# Altium footprint library EwgConnectors.PcbLib: 125 footprints (part 5 of 8)
Each footprint in its own frame and in the unit in brackets; x right, y up, seen from the top. Pads: shape width x height; smd on the part's side, far side on the other; paste and mask are expansions set on the pad; w line width, h text height; cw(c..) or ccw(c..) is an arc to the next point about the centre after c.
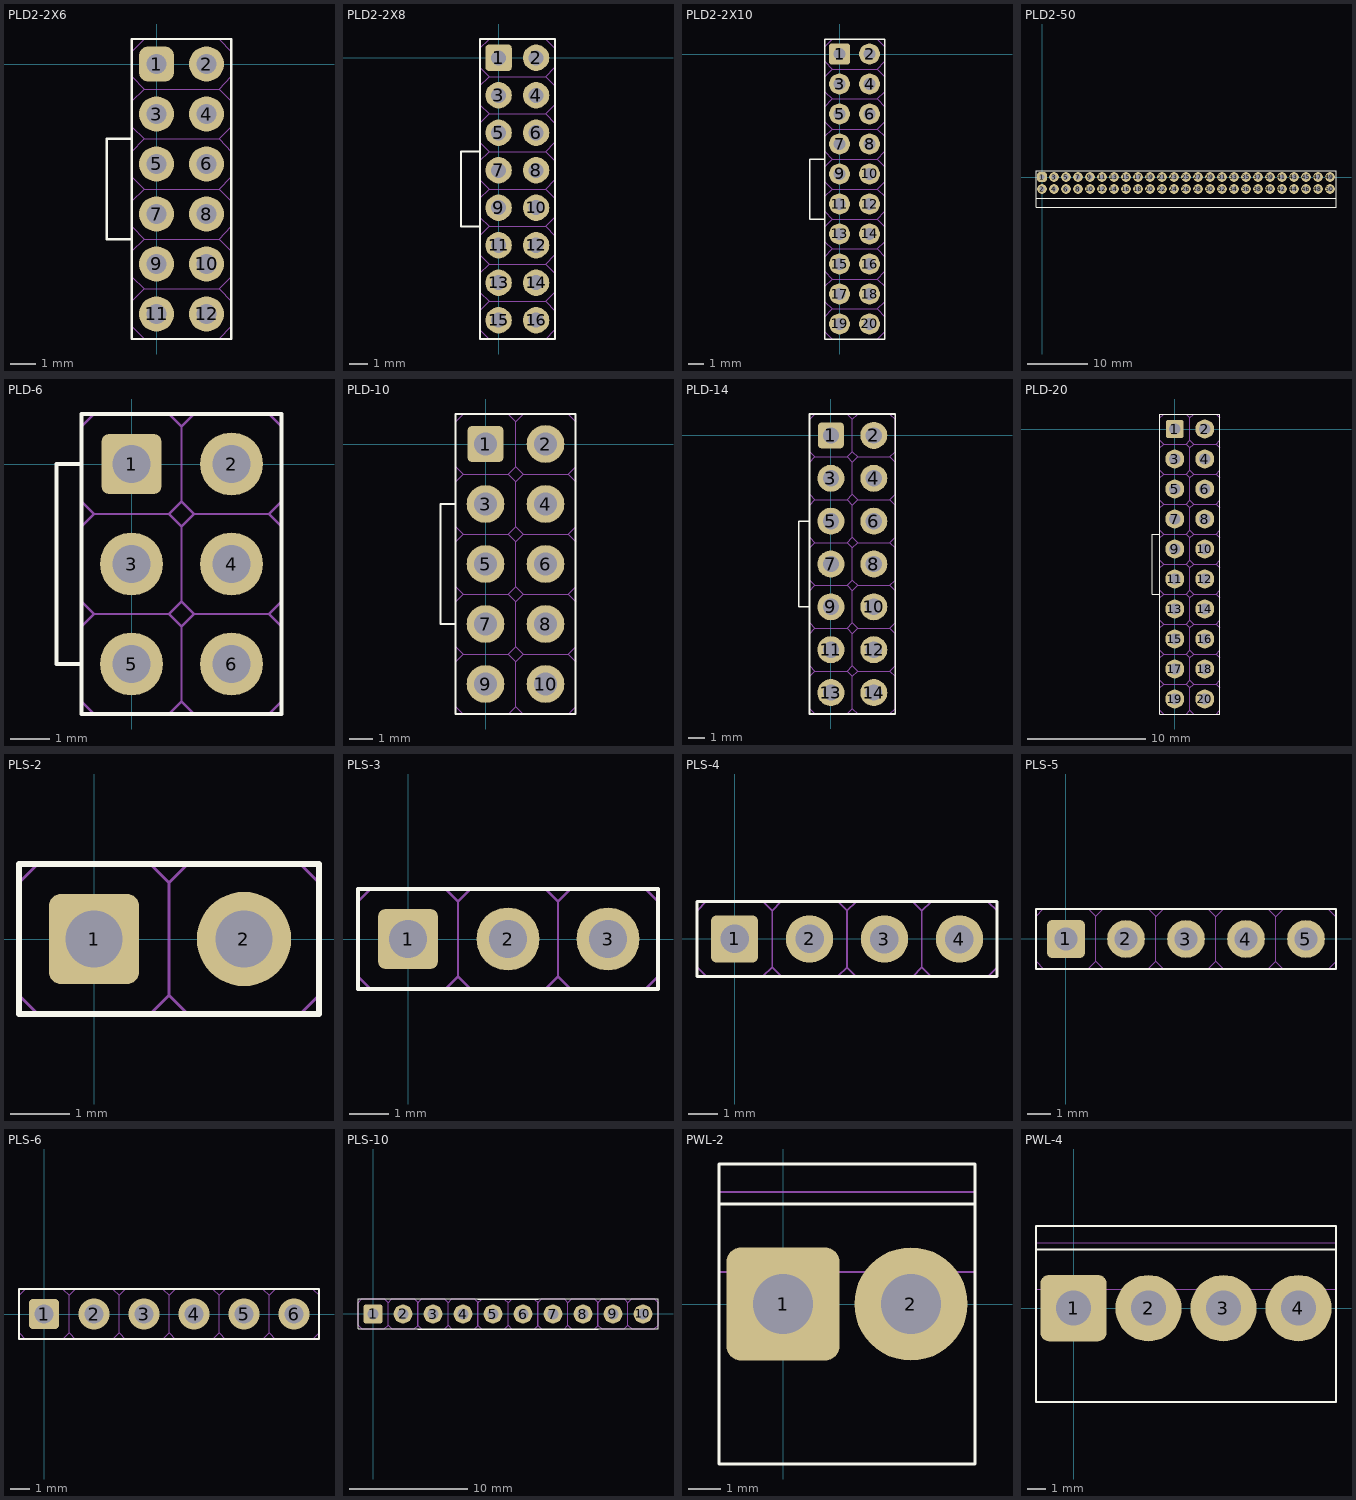
[diagram p4: the footprints below, top view; thin cyan lines are the x and y axes]

## PLD2-2X6 [mm]
pads (12):
  rrect50% 1.4x1.4 hole 0.8: 1(0,0)
  round 1.4 hole 0.8: 2(2,0) 3(0,-2) 4(2,-2) 5(0,-4) 6(2,-4) 7(0,-6) 8(2,-6) 9(0,-8) 10(2,-8) 12(2,-10)
  round 1.4 hole 0.8 paste+0: 11(0,-10)
Top Overlay:
  lines w0.1: -1,-7 -2,-7 -2,-3 -1,-3 ; -1,-11 -1,1 3,1 3,-11 -1,-11
Mechanical 1:
  lines w0.05: -0.5,-9 -1,-9.5 -1,-10.5 -0.5,-11 2.5,-11 3,-10.5 3,-9.5 2.5,-9 ; -0.5,-9 2.5,-9 ; -0.5,-9 2.5,-9 ; -0.5,-9 2.5,-9 ; -0.5,-9 -1,-8.5 -1,-7.5 -0.5,-7 ; -0.5,-7 2.5,-7 ; -0.5,-7 2.5,-7 ; -0.5,-7 -1,-6.5 -1,-5.5 -0.5,-5 ; -0.5,-5 2.5,-5 ; -0.5,-5 2.5,-5 ; -0.5,-5 -1,-4.5 -1,-3.5 -0.5,-3 ; -0.5,-3 2.5,-3 ; -0.5,-3 2.5,-3 ; -0.5,-3 -1,-2.5 -1,-1.5 -0.5,-1 ; -0.5,-1 2.5,-1 ; -0.5,-1 2.5,-1 ; -0.5,-1 -1,-0.5 -1,0.5 -0.5,1 2.5,1 3,0.5 3,-0.5 2.5,-1 ; 2.5,-9 3,-8.5 3,-7.5 2.5,-7 ; 2.5,-7 3,-6.5 3,-5.5 2.5,-5 ; 2.5,-5 3,-4.5 3,-3.5 2.5,-3 ; 2.5,-3 3,-2.5 3,-1.5 2.5,-1 ; -0.25,-10.25 -0.25,-9.75 0.25,-9.75 0.25,-10.25 -0.25,-10.25 ; -0.25,-8.25 0.25,-8.25 0.25,-7.75 -0.25,-7.75 -0.25,-8.25 ; -0.25,-6.25 0.25,-6.25 0.25,-5.75 -0.25,-5.75 -0.25,-6.25 ; -0.25,-4.25 0.25,-4.25 0.25,-3.75 -0.25,-3.75 -0.25,-4.25 ; -0.25,-2.25 0.25,-2.25 0.25,-1.75 -0.25,-1.75 -0.25,-2.25 ; -0.25,-0.25 0.25,-0.25 0.25,0.25 -0.25,0.25 -0.25,-0.25 ; 1.75,-10.25 1.75,-9.75 2.25,-9.75 2.25,-10.25 1.75,-10.25 ; 1.75,-8.25 2.25,-8.25 2.25,-7.75 1.75,-7.75 1.75,-8.25 ; 1.75,-6.25 2.25,-6.25 2.25,-5.75 1.75,-5.75 1.75,-6.25 ; 1.75,-4.25 2.25,-4.25 2.25,-3.75 1.75,-3.75 1.75,-4.25 ; 1.75,-2.25 2.25,-2.25 2.25,-1.75 1.75,-1.75 1.75,-2.25 ; 1.75,-0.25 2.25,-0.25 2.25,0.25 1.75,0.25 1.75,-0.25
3D body: height 6, standoff -2.8, extent -1,-11 3,1

## PLD2-2X8 [mm]
pads (16):
  rrect25% 1.4x1.4 hole 0.8: 1(0,0)
  round 1.4 hole 0.8: 2(2,0) 3(0,-2) 4(2,-2) 5(0,-4) 6(2,-4) 7(0,-6) 8(2,-6) 9(0,-8) 10(2,-8) 11(0,-10) 12(2,-10) 13(0,-12) 14(2,-12) 15(0,-14) 16(2,-14)
Top Overlay:
  lines w0.1: -1,-9 -2,-9 -2,-5 -1,-5 ; -1,-15 -1,1 3,1 3,-15 -1,-15
Mechanical 1:
  lines w0.05: -0.5,-13 -1,-12.5 -1,-11.5 -0.5,-11 ; -0.5,-13 -1,-13.5 -1,-14.5 -0.5,-15 2.5,-15 3,-14.5 3,-13.5 2.5,-13 ; -0.5,-13 2.5,-13 ; -0.5,-13 2.5,-13 ; -0.5,-11 -1,-10.5 -1,-9.5 -0.5,-9 ; -0.5,-11 2.5,-11 ; -0.5,-11 2.5,-11 ; -0.5,-9 -1,-8.5 -1,-7.5 -0.5,-7 ; -0.5,-9 2.5,-9 ; -0.5,-9 2.5,-9 ; -0.5,-7 -1,-6.5 -1,-5.5 -0.5,-5 ; -0.5,-7 2.5,-7 ; -0.5,-7 2.5,-7 ; -0.5,-5 -1,-4.5 -1,-3.5 -0.5,-3 ; -0.5,-5 2.5,-5 ; -0.5,-5 2.5,-5 ; -0.5,-3 -1,-2.5 -1,-1.5 -0.5,-1 ; -0.5,-3 2.5,-3 ; -0.5,-3 2.5,-3 ; -0.5,-1 -1,-0.5 -1,0.5 -0.5,1 2.5,1 3,0.5 3,-0.5 2.5,-1 ; -0.5,-1 2.5,-1 ; -0.5,-1 2.5,-1 ; 2.5,-13 3,-12.5 3,-11.5 2.5,-11 ; 2.5,-11 3,-10.5 3,-9.5 2.5,-9 ; 2.5,-9 3,-8.5 3,-7.5 2.5,-7 ; 2.5,-7 3,-6.5 3,-5.5 2.5,-5 ; 2.5,-5 3,-4.5 3,-3.5 2.5,-3 ; 2.5,-3 3,-2.5 3,-1.5 2.5,-1 ; -0.25,-14.25 -0.25,-13.75 0.25,-13.75 0.25,-14.25 -0.25,-14.25 ; -0.25,-12.25 -0.25,-11.75 0.25,-11.75 0.25,-12.25 -0.25,-12.25 ; -0.25,-10.25 -0.25,-9.75 0.25,-9.75 0.25,-10.25 -0.25,-10.25 ; -0.25,-8.25 -0.25,-7.75 0.25,-7.75 0.25,-8.25 -0.25,-8.25 ; -0.25,-6.25 -0.25,-5.75 0.25,-5.75 0.25,-6.25 -0.25,-6.25 ; -0.25,-4.25 -0.25,-3.75 0.25,-3.75 0.25,-4.25 -0.25,-4.25 ; -0.25,-2.25 -0.25,-1.75 0.25,-1.75 0.25,-2.25 -0.25,-2.25 ; -0.25,-0.25 -0.25,0.25 0.25,0.25 0.25,-0.25 -0.25,-0.25 ; 1.75,-14.25 1.75,-13.75 2.25,-13.75 2.25,-14.25 1.75,-14.25 ; 1.75,-12.25 1.75,-11.75 2.25,-11.75 2.25,-12.25 1.75,-12.25 ; 1.75,-10.25 1.75,-9.75 2.25,-9.75 2.25,-10.25 1.75,-10.25 ; 1.75,-8.25 1.75,-7.75 2.25,-7.75 2.25,-8.25 1.75,-8.25 ; 1.75,-6.25 1.75,-5.75 2.25,-5.75 2.25,-6.25 1.75,-6.25 ; 1.75,-4.25 1.75,-3.75 2.25,-3.75 2.25,-4.25 1.75,-4.25 ; 1.75,-2.25 1.75,-1.75 2.25,-1.75 2.25,-2.25 1.75,-2.25 ; 1.75,-0.25 2.25,-0.25 2.25,0.25 1.75,0.25 1.75,-0.25

## PLD2-2X10 [mm]
pads (20):
  rrect25% 1.4x1.4 hole 0.8: 1(0,0)
  round 1.4 hole 0.8: 2(2,0) 3(0,-2) 4(2,-2) 5(0,-4) 6(2,-4) 7(0,-6) 8(2,-6) 9(0,-8) 10(2,-8) 11(0,-10) 12(2,-10) 13(0,-12) 14(2,-12) 15(0,-14) 16(2,-14) 17(0,-16) 18(2,-16) 19(0,-18) 20(2,-18)
Top Overlay:
  lines w0.1: -1,-11 -2,-11 -2,-7 -1,-7 ; -1,-19 3,-19 3,1 -1,1 -1,-19
Mechanical 1:
  drawing of 160 lines, arcs and shapes, not listed

## PLD2-50 [mm] "PLD2-50"
pads (50):
  rrect50% 1.6x1.6 hole 0.8: 1(0,0)
  round 1.6 hole 0.8: 2(0,-2) 3(2,0) 4(2,-2) 5(4,0) 6(4,-2) 7(6,0) 8(6,-2) 9(8,0) 10(8,-2) 11(10,0) 12(10,-2) 13(12,0) 14(12,-2) 15(14,0) 16(14,-2) 17(16,0) 18(16,-2) 19(18,0) 20(18,-2) 21(20,0) 22(20,-2) 23(22,0) 24(22,-2) 25(24,0) 26(24,-2) 27(26,0) 28(26,-2) 29(28,0) 30(28,-2) 31(30,0) 32(30,-2) 33(32,0) 34(32,-2) 35(34,0) 36(34,-2) 37(36,0) 38(36,-2) 39(38,0) 40(38,-2) 41(40,0) 42(40,-2) 43(42,0) 44(42,-2) 45(44,0) 46(44,-2) 47(46,0) 48(46,-2) 49(48,0) 50(48,-2)
Top Overlay:
  lines w0.1: -1,-3.5 49,-3.5 ; -1,-3.5 -1,-5 49,-5 49,-3.5 ; -1,-3.5 -1,1 49,1 49,-3.5
3D body: height 4, standoff -2.8, extent -1,-9 49,0.25

## PLD-6 [mm]
pads (6):
  rrect25% 1.524x1.524 hole 0.965: 1(0,0)
  round 1.6 hole 0.965: 2(2.54,0) 3(0,-2.54) 4(2.54,-2.54) 5(0,-5.08) 6(2.54,-5.08)
Top Overlay:
  lines w0.1: -1.27,-2.54 -1.27,-5.08 -1.905,-5.08 -1.905,0 -1.27,0 ; -1.27,-6.35 -1.27,-3.81 -1.27,-1.27 -1.27,1.27 3.81,1.27 3.81,-1.27 3.81,-3.81 3.81,-6.35 -1.27,-6.35
Mechanical 1:
  lines w0.05: -0.953,-6.35 -1.27,-6.032 -1.27,-4.127 -0.953,-3.81 ; -0.953,-6.35 0.953,-6.35 ; -0.953,-6.35 0.953,-6.35 ; -0.953,-3.81 -1.27,-3.492 -1.27,-1.587 -0.953,-1.27 ; -0.953,-3.81 0.953,-3.81 ; -0.953,-3.81 0.953,-3.81 ; -0.953,-1.27 -1.27,-0.953 -1.27,0.953 -0.953,1.27 0.953,1.27 1.27,0.953 ; -0.953,-1.27 0.953,-1.27 ; -0.953,-1.27 0.953,-1.27 ; 0.953,-6.35 1.27,-6.032 ; 0.953,-3.81 1.27,-3.492 ; 0.953,-3.81 1.27,-4.127 ; 0.953,-1.27 1.27,-0.953 ; 0.953,-1.27 1.27,-1.587 ; 1.27,-6.032 1.587,-6.35 ; 1.27,-6.032 1.27,-4.127 ; 1.27,-4.127 1.587,-3.81 ; 1.27,-3.492 1.587,-3.81 ; 1.27,-3.492 1.27,-1.587 ; 1.27,-1.587 1.587,-1.27 ; 1.27,-0.953 1.587,-1.27 ; 1.27,-0.953 1.27,0.953 ; 1.27,0.953 1.587,1.27 3.492,1.27 3.81,0.953 3.81,-0.953 3.492,-1.27 ; 1.587,-6.35 3.492,-6.35 ; 1.587,-6.35 3.492,-6.35 ; 1.587,-3.81 3.492,-3.81 ; 1.587,-3.81 3.492,-3.81 ; 1.587,-1.27 3.492,-1.27 ; 1.587,-1.27 3.492,-1.27 ; 3.492,-6.35 3.81,-6.032 3.81,-4.127 3.492,-3.81 ; 3.492,-3.81 3.81,-3.492 3.81,-1.587 3.492,-1.27 ; -0.318,-5.397 -0.318,-4.763 0.318,-4.763 0.318,-5.397 -0.318,-5.397 ; -0.318,-2.857 -0.318,-2.222 0.318,-2.222 0.318,-2.857 -0.318,-2.857 ; -0.318,-0.318 -0.318,0.318 0.318,0.318 0.318,-0.318 -0.318,-0.318 ; 2.222,-5.397 2.857,-5.397 2.857,-4.763 2.222,-4.763 2.222,-5.397 ; 2.222,-2.857 2.857,-2.857 2.857,-2.222 2.222,-2.222 2.222,-2.857 ; 2.222,-0.318 2.222,0.318 2.857,0.318 2.857,-0.318 2.222,-0.318

## PLD-10 [mm]
pads (10):
  rrect25% 1.524x1.524 hole 0.965: 1(0,0)
  round 1.6 hole 0.965: 2(2.54,0) 3(0,-2.54) 4(2.54,-2.54) 5(0,-5.08) 6(2.54,-5.08) 7(0,-7.62) 8(2.54,-7.62) 9(0,-10.16) 10(2.54,-10.16)
Top Overlay:
  lines w0.1: -1.27,-5.08 -1.27,-2.54 -1.905,-2.54 -1.905,-7.62 -1.27,-7.62 ; -1.27,-7.62 -1.27,-11.43 3.81,-11.43 3.81,-8.89 3.81,-6.35 3.81,-3.81 3.81,-1.27 3.81,1.27 -1.27,1.27 -1.27,-1.27 -1.27,-3.81 -1.27,-7.62
Mechanical 1:
  lines w0.05: -0.953,-8.89 0.953,-8.89 ; -0.953,-8.89 0.953,-8.89 ; -0.953,-8.89 -1.27,-9.207 -1.27,-11.112 -0.953,-11.43 0.953,-11.43 1.27,-11.112 ; -0.953,-8.89 -1.27,-8.572 -1.27,-6.667 -0.953,-6.35 ; -0.953,-6.35 0.953,-6.35 ; -0.953,-6.35 0.953,-6.35 ; -0.953,-6.35 -1.27,-6.032 -1.27,-4.127 -0.953,-3.81 ; -0.953,-3.81 0.953,-3.81 ; -0.953,-3.81 0.953,-3.81 ; -0.953,-3.81 -1.27,-3.492 -1.27,-1.587 -0.953,-1.27 ; -0.953,-1.27 0.953,-1.27 ; -0.953,-1.27 0.953,-1.27 ; -0.953,-1.27 -1.27,-0.953 -1.27,0.953 -0.953,1.27 0.953,1.27 1.27,0.953 ; 0.953,-8.89 1.27,-9.207 ; 0.953,-8.89 1.27,-8.572 ; 0.953,-6.35 1.27,-6.667 ; 0.953,-6.35 1.27,-6.032 ; 0.953,-3.81 1.27,-4.127 ; 0.953,-3.81 1.27,-3.492 ; 0.953,-1.27 1.27,-1.587 ; 0.953,-1.27 1.27,-0.953 ; 1.27,-11.112 1.27,-9.207 ; 1.27,-11.112 1.587,-11.43 3.492,-11.43 3.81,-11.112 3.81,-9.207 3.492,-8.89 ; 1.27,-9.207 1.587,-8.89 ; 1.27,-8.572 1.27,-6.667 ; 1.27,-8.572 1.587,-8.89 ; 1.27,-6.667 1.587,-6.35 ; 1.27,-6.032 1.27,-4.127 ; 1.27,-6.032 1.587,-6.35 ; 1.27,-4.127 1.587,-3.81 ; 1.27,-3.492 1.27,-1.587 ; 1.27,-3.492 1.587,-3.81 ; 1.27,-1.587 1.587,-1.27 ; 1.27,-0.953 1.27,0.953 ; 1.27,-0.953 1.587,-1.27 ; 1.27,0.953 1.587,1.27 3.492,1.27 3.81,0.953 3.81,-0.953 3.492,-1.27 ; 1.587,-8.89 3.492,-8.89 ; 1.587,-8.89 3.492,-8.89 ; 1.587,-6.35 3.492,-6.35 ; 1.587,-6.35 3.492,-6.35 ; 1.587,-3.81 3.492,-3.81 ; 1.587,-3.81 3.492,-3.81 ; 1.587,-1.27 3.492,-1.27 ; 1.587,-1.27 3.492,-1.27 ; 3.492,-8.89 3.81,-8.572 3.81,-6.667 3.492,-6.35 ; 3.492,-6.35 3.81,-6.032 3.81,-4.127 3.492,-3.81 ; 3.492,-3.81 3.81,-3.492 3.81,-1.587 3.492,-1.27 ; -0.318,-10.477 0.318,-10.477 0.318,-9.842 -0.318,-9.842 -0.318,-10.477 ; -0.318,-7.938 0.318,-7.938 0.318,-7.302 -0.318,-7.302 -0.318,-7.938 ; -0.318,-5.397 0.318,-5.397 0.318,-4.763 -0.318,-4.763 -0.318,-5.397 ; -0.318,-2.857 0.318,-2.857 0.318,-2.222 -0.318,-2.222 -0.318,-2.857 ; -0.318,-0.318 0.318,-0.318 0.318,0.318 -0.318,0.318 -0.318,-0.318 ; 2.222,-10.477 2.222,-9.842 2.857,-9.842 2.857,-10.477 2.222,-10.477 ; 2.222,-7.938 2.857,-7.938 2.857,-7.302 2.222,-7.302 2.222,-7.938 ; 2.222,-5.397 2.857,-5.397 2.857,-4.763 2.222,-4.763 2.222,-5.397 ; 2.222,-2.857 2.222,-2.222 2.857,-2.222 2.857,-2.857 2.222,-2.857 ; 2.222,-0.318 2.857,-0.318 2.857,0.318 2.222,0.318 2.222,-0.318

## PLD-14 [mm]
pads (14):
  rrect25% 1.524x1.524 hole 0.965: 1(0,0)
  round 1.6 hole 0.965: 2(2.54,0) 3(0,-2.54) 4(2.54,-2.54) 5(0,-5.08) 6(2.54,-5.08) 7(0,-7.62) 8(2.54,-7.62) 9(0,-10.16) 10(2.54,-10.16) 11(0,-12.7) 12(2.54,-12.7) 13(0,-15.24) 14(2.54,-15.24)
Top Overlay:
  lines w0.1: -1.27,-10.16 -1.905,-10.16 -1.905,-5.08 -1.27,-5.08 ; -1.27,-16.51 -1.27,-13.97 -1.27,-11.43 -1.27,-8.89 -1.27,-6.35 -1.27,-3.81 -1.27,-1.27 -1.27,1.27 3.81,1.27 3.81,-1.27 3.81,-3.81 3.81,-6.35 3.81,-8.89 3.81,-11.43 3.81,-13.97 3.81,-16.51 -1.27,-16.51
Mechanical 1:
  drawing of 161 lines, arcs and shapes, not listed

## PLD-20 [mm]
pads (20):
  rrect25% 1.524x1.524 hole 0.965: 1(0,0)
  round 1.6 hole 0.965: 2(2.54,0) 3(0,-2.54) 4(2.54,-2.54) 5(0,-5.08) 6(2.54,-5.08) 7(0,-7.62) 8(2.54,-7.62) 9(0,-10.16) 10(2.54,-10.16) 11(0,-12.7) 12(2.54,-12.7) 13(0,-15.24) 14(2.54,-15.24) 15(0,-17.78) 16(2.54,-17.78) 17(0,-20.32) 18(2.54,-20.32) 19(0,-22.86) 20(2.54,-22.86)
Top Overlay:
  lines w0.1: -1.27,-13.97 -1.27,-11.43 -1.27,-8.89 ; -1.27,-13.97 -1.27,-16.51 -1.27,-24.13 3.81,-24.13 3.81,-16.51 3.81,-13.97 3.81,-11.43 3.81,-8.89 3.81,-6.35 3.81,-3.81 3.81,-1.27 3.81,1.27 -1.27,1.27 -1.27,-1.27 -1.27,-3.81 -1.27,-6.35 -1.27,-8.89 ; -1.27,-13.97 -1.905,-13.97 -1.905,-8.89 -1.27,-8.89
Mechanical 1:
  drawing of 228 lines, arcs and shapes, not listed

## PLS-2 [mil]
pads (2):
  rrect25% 60x60 hole 38: 1(0,0)
  round 62.99 hole 38: 2(100,0)
Top Overlay:
  lines w3.94: -50,-50 -50,50 150,50 150,-50 -50,-50
Mechanical 1:
  lines w1.97: 50,-37.5 37.5,-50 -37.5,-50 -50,-37.5 -50,37.5 -37.5,50 37.5,50 50,37.5 ; 50,-37.5 62.5,-50 137.5,-50 150,-37.5 150,37.5 137.5,50 62.5,50 50,37.5 ; 50,-37.5 50,37.5 ; -12.5,-12.5 -12.5,12.5 12.5,12.5 12.5,-12.5 -12.5,-12.5 ; 87.5,-12.5 112.5,-12.5 112.5,12.5 87.5,12.5 87.5,-12.5
3D body: height 336.22, standoff -118.11, extent -49.99,-49.99 50.01,50.01
3D body: height 336.22, standoff -118.11, extent 50,-49.99 150,50.01

## PLS-3 [mil]
pads (3):
  rrect25% 60x60 hole 38: 1(0,0)
  round 62.99 hole 38: 2(100,0) 3(200,0)
Top Overlay:
  lines w3.94: -50,-50 250,-50 250,50 -50,50 -50,-50
Mechanical 1:
  lines w1.97: 50,-37.5 50,37.5 ; 50,-37.5 62.5,-50 137.5,-50 150,-37.5 ; 50,-37.5 37.5,-50 -37.5,-50 -50,-37.5 -50,37.5 -37.5,50 37.5,50 50,37.5 ; 50,37.5 62.5,50 137.5,50 150,37.5 ; 150,-37.5 150,37.5 ; 150,-37.5 162.5,-50 237.5,-50 250,-37.5 250,37.5 237.5,50 162.5,50 150,37.5 ; -12.5,-12.5 12.5,-12.5 12.5,12.5 -12.5,12.5 -12.5,-12.5 ; 87.5,-12.5 87.5,12.5 112.5,12.5 112.5,-12.5 87.5,-12.5 ; 187.5,-12.5 187.5,12.5 212.5,12.5 212.5,-12.5 187.5,-12.5
3D body: height 420, standoff -110, extent -50.39,-50.94 249.61,49.06

## PLS-4 [mm]
pads (4):
  rrect25% 1.6x1.6 hole 0.965: 1(0,0)
  round 1.6 hole 0.965: 2(2.54,0) 3(5.08,0) 4(7.62,0)
Top Overlay:
  lines w0.1: 3.81,-1.27 8.89,-1.27 8.89,1.27 ; 8.75,-1.27 -1.27,-1.27 -1.27,1.27 8.875,1.27
Mechanical 1:
  lines w0.05: 1.27,-0.953 0.953,-1.27 -0.953,-1.27 -1.27,-0.953 -1.27,0.953 -0.953,1.27 0.953,1.27 1.27,0.953 ; 1.27,-0.953 1.587,-1.27 3.492,-1.27 3.81,-0.953 ; 1.27,-0.953 1.27,0.953 ; 1.27,0.953 1.587,1.27 3.492,1.27 3.81,0.953 ; 3.81,-0.953 3.81,0.952 ; 3.81,-0.953 4.127,-1.27 6.032,-1.27 6.35,-0.953 ; 3.81,-0.953 3.81,0.953 ; 3.81,0.952 4.127,1.27 6.032,1.27 6.35,0.952 ; 6.35,-0.953 6.35,0.952 ; 6.35,-0.953 6.667,-1.27 8.572,-1.27 8.89,-0.953 8.89,0.952 8.572,1.27 6.667,1.27 6.35,0.952 ; -0.318,-0.318 -0.318,0.318 0.318,0.318 0.318,-0.318 -0.318,-0.318 ; 2.222,-0.318 2.857,-0.318 2.857,0.318 2.222,0.318 2.222,-0.318 ; 4.762,-0.318 5.397,-0.318 5.397,0.317 4.762,0.317 4.762,-0.318 ; 7.302,-0.318 7.302,0.317 7.937,0.317 7.937,-0.318 7.302,-0.318
3D body: height 8.54, standoff -3, extent 6.35,-1.27 8.89,1.27
3D body: height 8.54, standoff -3, extent 3.81,-1.27 6.35,1.27
3D body: height 8.54, standoff -3, extent -1.27,-1.27 1.27,1.27
3D body: height 8.54, standoff -3, extent 1.27,-1.27 3.81,1.27

## PLS-5 [mm]
pads (5):
  rrect25% 1.6x1.6 hole 0.965: 1(0,0)
  round 1.6 hole 0.965: 2(2.54,0) 3(5.08,0) 4(7.62,0) 5(10.16,0)
Top Overlay:
  lines w0.1: 3.81,-1.27 8.89,-1.27 11.43,-1.27 ; 3.81,1.27 8.89,1.27 11.43,1.27 ; 11.43,-1.27 11.43,1.27 ; 11.43,-1.27 -1.27,-1.27 -1.27,1.27 11.43,1.27
Mechanical 1:
  lines w0.05: 1.27,-0.953 0.953,-1.27 -0.953,-1.27 -1.27,-0.953 -1.27,0.953 -0.953,1.27 0.953,1.27 1.27,0.953 ; 1.27,-0.953 1.587,-1.27 3.492,-1.27 3.81,-0.953 ; 1.27,-0.953 1.27,0.953 ; 1.27,0.953 1.587,1.27 3.492,1.27 3.81,0.953 ; 3.81,-0.953 3.81,0.952 ; 3.81,-0.953 4.127,-1.27 6.032,-1.27 6.35,-0.953 ; 3.81,-0.953 3.81,0.953 ; 3.81,0.952 4.127,1.27 6.032,1.27 6.35,0.952 ; 6.35,-0.953 6.35,0.952 ; 6.35,-0.953 6.667,-1.27 8.572,-1.27 8.89,-0.953 ; 6.35,0.952 6.667,1.27 8.572,1.27 8.89,0.952 ; 8.89,-0.953 8.89,0.952 ; 8.89,-0.953 9.207,-1.27 11.112,-1.27 11.43,-0.953 11.43,0.952 11.112,1.27 9.207,1.27 8.89,0.952 ; 8.89,-0.953 8.89,0.952 ; -0.318,-0.318 -0.318,0.318 0.318,0.318 0.318,-0.318 -0.318,-0.318 ; 2.222,-0.318 2.857,-0.318 2.857,0.318 2.222,0.318 2.222,-0.318 ; 4.762,-0.318 5.397,-0.318 5.397,0.317 4.762,0.317 4.762,-0.318 ; 7.302,-0.318 7.302,0.317 7.937,0.317 7.937,-0.318 7.302,-0.318 ; 9.842,-0.318 10.477,-0.318 10.477,0.317 9.842,0.317 9.842,-0.318
3D body: height 8.54, standoff -3, extent 8.89,-1.27 11.43,1.27
3D body: height 8.54, standoff -3, extent 6.35,-1.27 8.89,1.27
3D body: height 8.54, standoff -3, extent 3.81,-1.27 6.35,1.27
3D body: height 8.54, standoff -3, extent -1.27,-1.27 1.27,1.27
3D body: height 8.54, standoff -3, extent 1.27,-1.27 3.81,1.27

## PLS-6 [mm]
pads (6):
  rrect25% 1.524x1.524 hole 0.965: 1(0,0)
  round 1.6 hole 0.965: 2(2.54,0) 3(5.08,0) 4(7.62,0) 5(10.16,0) 6(12.7,0)
Top Overlay:
  lines w0.1: -1.27,-1.27 13.97,-1.27 13.97,1.27 -1.27,1.27 -1.27,-1.27
Mechanical 1:
  lines w0.05: 1.27,-0.953 1.27,0.953 ; 1.27,-0.953 1.587,-1.27 3.492,-1.27 3.81,-0.953 ; 1.27,-0.953 0.953,-1.27 -0.953,-1.27 -1.27,-0.953 -1.27,0.953 -0.953,1.27 0.953,1.27 1.27,0.953 ; 1.27,0.953 1.587,1.27 3.492,1.27 3.81,0.953 ; 3.81,-0.953 3.81,0.953 ; 3.81,-0.953 4.127,-1.27 6.032,-1.27 6.35,-0.953 ; 3.81,0.953 4.127,1.27 6.032,1.27 6.35,0.953 ; 6.35,-0.953 6.35,0.953 ; 6.35,-0.953 6.667,-1.27 8.572,-1.27 8.89,-0.953 ; 6.35,0.953 6.667,1.27 8.572,1.27 8.89,0.953 ; 8.89,-0.953 8.89,0.953 ; 8.89,-0.953 9.207,-1.27 11.112,-1.27 11.43,-0.953 ; 8.89,0.953 9.207,1.27 11.112,1.27 11.43,0.953 ; 11.43,-0.953 11.43,0.953 ; 11.43,-0.953 11.747,-1.27 13.652,-1.27 13.97,-0.953 13.97,0.953 13.652,1.27 11.747,1.27 11.43,0.953 ; -0.318,-0.318 0.318,-0.318 0.318,0.318 -0.318,0.318 -0.318,-0.318 ; 2.222,-0.318 2.222,0.318 2.857,0.318 2.857,-0.318 2.222,-0.318 ; 4.763,-0.318 4.763,0.318 5.397,0.318 5.397,-0.318 4.763,-0.318 ; 7.302,-0.318 7.938,-0.318 7.938,0.318 7.302,0.318 7.302,-0.318 ; 9.842,-0.318 9.842,0.318 10.477,0.318 10.477,-0.318 9.842,-0.318 ; 12.383,-0.318 12.383,0.318 13.018,0.318 13.018,-0.318 12.383,-0.318
3D body: height 10.67, standoff -2.79, extent 6.35,-1.27 13.97,1.27
3D body: height 10.67, standoff -2.79, extent -1.27,-1.27 6.35,1.27

## PLS-10 [mm]
pads (10):
  rrect25% 1.6x1.6 hole 0.965: 1(0,0)
  round 1.6 hole 0.965: 2(2.54,0) 3(5.08,0) 4(7.62,0) 5(10.16,0) 6(12.7,0) 7(15.24,0) 8(17.78,0) 9(20.32,0) 10(22.86,0)
Top Overlay:
  lines w0.1: 3.81,-1.27 8.89,-1.27 11.43,-1.27 ; 3.81,1.27 8.89,1.27 11.43,1.27 ; 19.05,-1.27 13.97,-1.27 11.43,-1.27 ; 19.05,1.27 13.97,1.27 11.43,1.27 ; 11.43,-1.27 24.13,-1.27 24.13,1.27 11.43,1.27 ; 11.43,-1.27 -1.27,-1.27 -1.27,1.27 11.43,1.27
Mechanical 1:
  lines w0.05: 1.27,-0.953 1.27,0.953 ; 1.27,-0.953 1.587,-1.27 3.492,-1.27 3.81,-0.953 ; 1.27,-0.953 0.953,-1.27 -0.953,-1.27 -1.27,-0.953 -1.27,0.953 -0.953,1.27 0.953,1.27 1.27,0.953 ; 1.27,0.953 1.587,1.27 3.492,1.27 3.81,0.953 ; 3.81,-0.953 3.81,0.953 ; 3.81,-0.953 4.127,-1.27 6.032,-1.27 6.35,-0.953 ; 3.81,-0.953 3.81,0.952 ; 3.81,0.952 4.127,1.27 6.032,1.27 6.35,0.952 ; 6.35,-0.953 6.667,-1.27 8.572,-1.27 8.89,-0.953 ; 6.35,-0.953 6.35,0.952 ; 6.35,0.952 6.667,1.27 8.572,1.27 8.89,0.952 ; 8.89,-0.953 8.89,0.952 ; 8.89,-0.953 9.207,-1.27 11.112,-1.27 11.43,-0.953 ; 8.89,-0.953 8.89,0.952 ; 8.89,0.952 9.207,1.27 11.112,1.27 11.43,0.952 ; 11.43,-0.953 11.43,0.952 ; 11.43,-0.953 11.747,-1.27 13.652,-1.27 13.97,-0.953 ; 11.43,-0.953 11.43,0.952 ; 11.43,0.952 11.747,1.27 13.652,1.27 13.97,0.952 ; 13.97,-0.953 13.97,0.952 ; 13.97,-0.953 13.97,0.952 ; 13.97,-0.953 14.287,-1.27 16.192,-1.27 16.51,-0.953 ; 13.97,0.952 14.287,1.27 16.192,1.27 16.51,0.952 ; 16.51,-0.953 16.51,0.952 ; 16.51,-0.953 16.827,-1.27 18.732,-1.27 19.05,-0.953 ; 16.51,0.952 16.827,1.27 18.732,1.27 19.05,0.952 ; 19.05,-0.953 19.05,0.952 ; 19.05,-0.953 19.367,-1.27 21.272,-1.27 21.59,-0.953 ; 19.05,-0.953 19.05,0.953 ; 19.05,0.953 19.367,1.27 21.272,1.27 21.59,0.953 ; 21.59,-0.953 21.907,-1.27 23.812,-1.27 24.13,-0.953 24.13,0.953 23.812,1.27 21.907,1.27 21.59,0.953 ; 21.59,-0.953 21.59,0.953 ; -0.318,-0.318 0.318,-0.318 0.318,0.318 -0.318,0.318 -0.318,-0.318 ; 2.222,-0.318 2.222,0.318 2.857,0.318 2.857,-0.318 2.222,-0.318 ; 4.762,-0.318 4.762,0.317 5.397,0.317 5.397,-0.318 4.762,-0.318 ; 7.302,-0.318 7.937,-0.318 7.937,0.317 7.302,0.317 7.302,-0.318 ; 9.842,-0.318 9.842,0.317 10.477,0.317 10.477,-0.318 9.842,-0.318 ; 12.382,-0.318 13.017,-0.318 13.017,0.317 12.382,0.317 12.382,-0.318 ; 14.922,-0.318 14.922,0.317 15.557,0.317 15.557,-0.318 14.922,-0.318 ; 17.462,-0.318 18.097,-0.318 18.097,0.317 17.462,0.317 17.462,-0.318 ; 20.002,-0.318 20.637,-0.318 20.637,0.318 20.002,0.318 20.002,-0.318 ; 22.542,-0.318 22.542,0.318 23.177,0.318 23.177,-0.318 22.542,-0.318
3D body: height 8.54, standoff -3, extent 11.43,-1.27 13.97,1.27
3D body: height 8.54, standoff -3, extent 13.97,-1.27 16.51,1.27
3D body: height 8.54, standoff -3, extent 16.51,-1.27 19.05,1.27
3D body: height 8.54, standoff -3, extent 21.589,-1.27 24.129,1.27
3D body: height 8.54, standoff -3, extent 19.05,-1.27 21.59,1.27
3D body: height 8.54, standoff -3, extent 1.27,-1.27 3.81,1.27
3D body: height 8.54, standoff -3, extent -1.27,-1.27 1.27,1.27
3D body: height 8.54, standoff -3, extent 3.81,-1.27 6.35,1.27
3D body: height 8.54, standoff -3, extent 6.35,-1.27 8.89,1.27
3D body: height 8.54, standoff -3, extent 8.89,-1.27 11.43,1.27

## PWL-2 [mm]
pads (2):
  rrect25% 3.5x3.5 hole 1.85: 1(0,0)
  round 3.5 hole 1.85: 2(3.96,0)
Top Overlay:
  lines w0.1: -1.98,3.094 5.94,3.094 ; -1.98,-4.95 -1.98,4.331 5.94,4.331 5.94,-4.95 -1.98,-4.95
Mechanical 1:
  lines w0.05: -1.98,0.99 5.94,0.99 ; -1.98,3.465 5.94,3.465 ; -0.619,-0.619 0.619,-0.619 ; -0.619,-0.619 -0.619,0.619 ; -0.619,-0.619 -0.371,-0.371 ; -0.619,0.619 0.619,0.619 ; -0.619,0.619 -0.371,0.371 ; -0.371,-0.371 -0.371,0.371 ; -0.371,-0.371 0.371,-0.371 ; -0.371,0.371 0.371,0.371 ; 0.371,-0.371 0.371,0.371 ; 0.371,-0.371 0.619,-0.619 ; 0.371,0.371 0.619,0.619 ; 0.619,-0.619 0.619,0.619 ; 3.341,-0.619 4.579,-0.619 ; 3.341,-0.619 3.341,0.619 ; 3.341,-0.619 3.589,-0.371 ; 3.341,0.619 4.579,0.619 ; 3.341,0.619 3.589,0.371 ; 3.589,-0.371 3.589,0.371 ; 3.589,-0.371 4.331,-0.371 ; 3.589,0.371 4.331,0.371 ; 4.331,-0.371 4.331,0.371 ; 4.331,-0.371 4.579,-0.619 ; 4.331,0.371 4.579,0.619 ; 4.579,-0.619 4.579,0.619 ; -1.98,-4.95 -1.98,4.331 5.94,4.331 5.94,-4.95 -1.98,-4.95

## PWL-4 [mm]
pads (4):
  rrect25% 3.5x3.5 hole 1.85: 1(0,0)
  round 3.5 hole 1.85: 2(3.96,0) 3(7.92,0) 4(11.88,0)
Top Overlay:
  lines w0.1: -1.98,3.094 13.86,3.094 ; -1.98,-4.95 13.86,-4.95 13.86,4.331 -1.98,4.331 -1.98,-4.95
Mechanical 1:
  lines w0.05: -1.98,0.99 13.86,0.99 ; -1.98,3.465 13.86,3.465 ; -0.619,-0.619 -0.371,-0.371 ; -0.619,-0.619 -0.619,0.619 ; -0.619,-0.619 0.619,-0.619 ; -0.619,0.619 -0.371,0.371 ; -0.619,0.619 0.619,0.619 ; -0.371,-0.371 0.371,-0.371 ; -0.371,-0.371 -0.371,0.371 ; -0.371,0.371 0.371,0.371 ; 0.371,-0.371 0.619,-0.619 ; 0.371,-0.371 0.371,0.371 ; 0.371,0.371 0.619,0.619 ; 0.619,-0.619 0.619,0.619 ; 3.341,-0.619 3.589,-0.371 ; 3.341,-0.619 3.341,0.619 ; 3.341,-0.619 4.579,-0.619 ; 3.341,0.619 3.589,0.371 ; 3.341,0.619 4.579,0.619 ; 3.589,-0.371 4.331,-0.371 ; 3.589,-0.371 3.589,0.371 ; 3.589,0.371 4.331,0.371 ; 4.331,-0.371 4.579,-0.619 ; 4.331,-0.371 4.331,0.371 ; 4.331,0.371 4.579,0.619 ; 4.579,-0.619 4.579,0.619 ; 7.301,-0.619 7.549,-0.371 ; 7.301,-0.619 7.301,0.619 ; 7.301,-0.619 8.539,-0.619 ; 7.301,0.619 7.549,0.371 ; 7.301,0.619 8.539,0.619 ; 7.549,-0.371 8.291,-0.371 ; 7.549,-0.371 7.549,0.371 ; 7.549,0.371 8.291,0.371 ; 8.291,-0.371 8.539,-0.619 ; 8.291,-0.371 8.291,0.371 ; 8.291,0.371 8.539,0.619 ; 8.539,-0.619 8.539,0.619 ; 11.261,-0.619 11.509,-0.371 ; 11.261,-0.619 11.261,0.619 ; 11.261,-0.619 12.499,-0.619 ; 11.261,0.619 11.509,0.371 ; 11.261,0.619 12.499,0.619 ; 11.509,-0.371 12.251,-0.371 ; 11.509,-0.371 11.509,0.371 ; 11.509,0.371 12.251,0.371 ; 12.251,-0.371 12.499,-0.619 ; 12.251,-0.371 12.251,0.371 ; 12.251,0.371 12.499,0.619 ; 12.499,-0.619 12.499,0.619 ; -1.98,-4.95 13.86,-4.95 13.86,4.331 -1.98,4.331 -1.98,-4.95